# Altium footprint library 自建库.PcbLib: 169 footprints (part 2 of 11)
Each footprint in its own frame and in the unit in brackets; x right, y up, seen from the top. Pads: shape width x height; smd on the part's side, far side on the other; paste and mask are expansions set on the pad; w line width, h text height; cw(c..) or ccw(c..) is an arc to the next point about the centre after c.
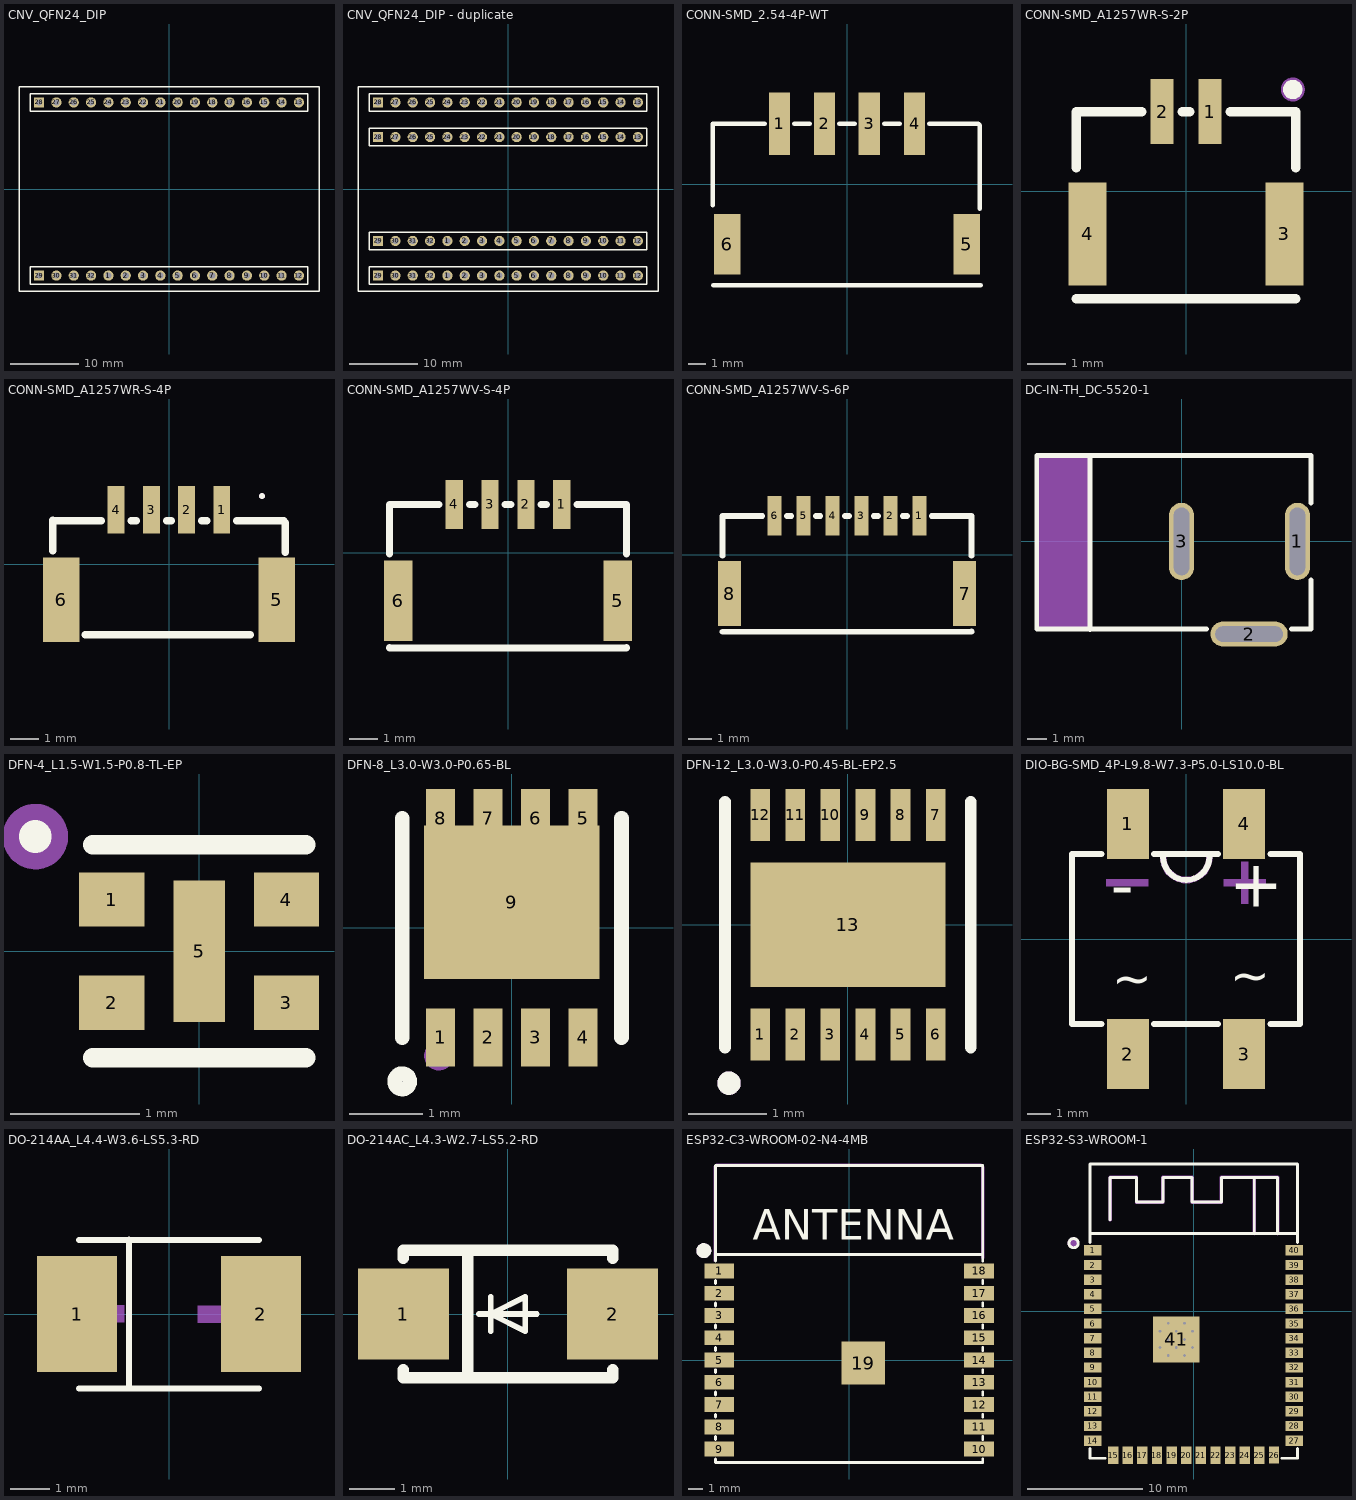
[diagram p1: the footprints below, top view; thin cyan lines are the x and y axes]

## CNV_QFN24_DIP [mm] "Connector; Header; 10 Position"
pads (32):
  round 1.5 hole 0.9: 1(-8.89,-12.7) 2(-6.35,-12.7) 3(-3.81,-12.7) 4(-1.27,-12.7) 5(1.27,-12.7) 6(3.81,-12.7) 7(6.35,-12.7) 8(8.89,-12.7) 9(11.43,-12.7) 10(13.97,-12.7) 11(16.51,-12.7) 12(19.05,-12.7) 13(19.05,12.7) 14(16.51,12.7) 15(13.97,12.7) 16(11.43,12.7) 17(8.89,12.7) 18(6.35,12.7) 19(3.81,12.7) 20(1.27,12.7) 21(-1.27,12.7) 22(-3.81,12.7) 23(-6.35,12.7) 24(-8.89,12.7) 25(-11.43,12.7) 26(-13.97,12.7) 27(-16.51,12.7) 30(-16.51,-12.7) 31(-13.97,-12.7) 32(-11.43,-12.7)
  rect 1.5x1.5 hole 0.9: 28(-19.05,12.7) 29(-19.05,-12.7)
Top Overlay:
  lines w0.2: -22,-15 22,-15 22,15 -22,15 -22,-15 ; -20.32,-13.97 -20.32,-11.43 20.32,-11.43 20.32,-13.97 -20.32,-13.97 ; -20.32,11.43 -20.32,13.97 20.32,13.97 20.32,11.43 -20.32,11.43

## CNV_QFN24_DIP - duplicate [mm] "Connector; Header; 10 Position"
pads (64):
  round 1.5 hole 0.9: 1(-8.89,-12.7) 1(-8.89,-7.62) 2(-6.35,-12.7) 2(-6.35,-7.62) 3(-3.81,-12.7) 3(-3.81,-7.62) 4(-1.27,-12.7) 4(-1.27,-7.62) 5(1.27,-12.7) 5(1.27,-7.62) 6(3.81,-12.7) 6(3.81,-7.62) 7(6.35,-12.7) 7(6.35,-7.62) 8(8.89,-12.7) 8(8.89,-7.62) 9(11.43,-12.7) 9(11.43,-7.62) 10(13.97,-12.7) 10(13.97,-7.62) 11(16.51,-12.7) 11(16.51,-7.62) 12(19.05,-12.7) 12(19.05,-7.62) 13(19.05,7.62) 13(19.05,12.7) 14(16.51,7.62) 14(16.51,12.7) 15(13.97,7.62) 15(13.97,12.7) 16(11.43,7.62) 16(11.43,12.7) 17(8.89,7.62) 17(8.89,12.7) 18(6.35,7.62) 18(6.35,12.7) 19(3.81,7.62) 19(3.81,12.7) 20(1.27,7.62) 20(1.27,12.7) 21(-1.27,7.62) 21(-1.27,12.7) 22(-3.81,7.62) 22(-3.81,12.7) 23(-6.35,7.62) 23(-6.35,12.7) 24(-8.89,7.62) 24(-8.89,12.7) 25(-11.43,7.62) 25(-11.43,12.7) 26(-13.97,7.62) 26(-13.97,12.7) 27(-16.51,7.62) 27(-16.51,12.7) 30(-16.51,-12.7) 30(-16.51,-7.62) 31(-13.97,-12.7) 31(-13.97,-7.62) 32(-11.43,-12.7) 32(-11.43,-7.62)
  rect 1.5x1.5 hole 0.9: 28(-19.05,7.62) 28(-19.05,12.7) 29(-19.05,-12.7) 29(-19.05,-7.62)
Top Overlay:
  lines w0.2: -20.32,6.35 -20.32,8.89 ; -20.32,6.367 20.32,6.367 ; -20.32,8.907 20.32,8.907 ; 20.32,6.35 20.32,8.89 ; -22,-15 -22,15 22,15 22,-15 -22,-15 ; -20.32,-13.97 20.32,-13.97 20.32,-11.43 -20.32,-11.43 -20.32,-13.97 ; -20.32,-8.89 20.32,-8.89 20.32,-6.35 -20.32,-6.35 -20.32,-8.89 ; -20.32,11.43 20.32,11.43 20.32,13.97 -20.32,13.97 -20.32,11.43

## CONN-SMD_2.54-4P-WT [mm] "XH2.54_卧贴"
pads (6):
  rect 1.2x3.5 smd: 1(-3.81,3.4) 2(-1.27,3.4) 3(1.25,3.4) 4(3.81,3.4)
  rect 1.5x3.4 smd: 5(6.76,-3.4) 6(-6.76,-3.4)
Top Overlay:
  lines w0.254: -7.56,-1.21 -7.56,3.4 -7.41,3.4 -4.641,3.4 ; -7.53,-5.71 7.54,-5.71 ; -2.979,3.4 -2.091,3.4 ; -0.429,3.4 0.449,3.4 ; 2.111,3.4 2.989,3.4 ; 4.651,3.4 7.41,3.4 7.5,3.31 7.5,-1.4
3D body "XH2_54-SMD-4pin.stp": height 6, standoff 0, extent -7.373,-4.572 7.627,7.928

## CONN-SMD_A1257WR-S-2P [mm] "GH1.25-2pin卧贴"
pads (4):
  rect 0.6x1.7 smd: 1(0.625,2.088) 2(-0.625,2.088)
  rect 1x2.7 smd: 3(2.575,-1.111) 4(-2.575,-1.111)
Top Overlay:
  circle w0.254: c2.794,2.667 r0.127
  lines w0.254: -2.875,-2.811 2.875,-2.811 ; -2.875,0.62 -2.875,2.088 -1.156,2.088 ; -0.094,2.088 0.094,2.088 ; 1.156,2.088 2.875,2.088 2.875,0.62
Mechanical 15:
  circle w0.254: c2.794,2.667 r0.187
3D body "GH1.25_2pin.STEP": height 4.13, standoff -0.02, extent -2.88,-2.506 2.88,2.046

## CONN-SMD_A1257WR-S-4P [mm] "GH1.25-4pin卧贴"
pads (6):
  rect 0.6x1.7 smd: 1(1.874,1.925) 2(0.625,1.925) 3(-0.625,1.925) 4(-1.875,1.925)
  rect 1.3x3 smd: 5(3.825,-1.275) 6(-3.825,-1.275)
Top Overlay:
  lines w0.2: 3.302,2.407 ccw(c3.202,2.413) 3.302,2.413
  lines w0.254: -4.126,0.462 -4.126,1.551 ; -4.108,1.533 -2.406,1.533 ; -2.983,-2.513 2.895,-2.513 ; -1.344,1.533 -1.156,1.533 ; -0.094,1.533 0.094,1.533 ; 1.156,1.533 1.344,1.533 ; 2.405,1.533 4.074,1.533 4.129,1.478 4.129,0.408
Mechanical 15:
  lines w0.2: 3.302,2.407 ccw(c3.202,2.413) 3.302,2.413
3D body "GH1.25_4pin.stp": height 4.35, standoff 0, extent -4.125,-2.576 4.125,2.224

## CONN-SMD_A1257WV-S-4P [mm] "GH1.25-4pin立贴"
pads (6):
  rect 0.6x1.7 smd: 1(1.875,1.675) 2(0.625,1.675) 3(-0.625,1.675) 4(-1.875,1.675)
  rect 1x2.8 smd: 5(3.825,-1.675) 6(-3.825,-1.675)
Top Overlay:
  lines w0.254: -4.125,-3.306 -4.125,-3.325 4.125,-3.325 4.125,-3.306 ; -4.125,-0.044 -4.125,1.675 -2.406,1.675 ; -1.344,1.675 -1.156,1.675 ; -0.094,1.675 0.094,1.675 ; 1.156,1.675 1.344,1.675 ; 2.406,1.675 4.125,1.675 4.125,-0.044
3D body "GH1.25_4pin.stp": height 4.35, standoff 0, extent -4.125,-3.048 4.125,1.752

## CONN-SMD_A1257WV-S-6P [mm] "GH1.25-6pin卧贴"
pads (8):
  rect 0.6x1.7 smd: 1(3.125,1.675) 2(1.875,1.675) 3(0.625,1.675) 4(-0.625,1.675) 5(-1.875,1.675) 6(-3.125,1.675)
  rect 1x2.8 smd: 7(5.075,-1.675) 8(-5.075,-1.675)
Top Overlay:
  lines w0.254: -5.375,-3.325 5.375,-3.325 5.375,-3.306 ; -5.375,-0.044 -5.375,1.675 -3.656,1.675 ; -2.594,1.675 -2.406,1.675 ; -1.344,1.675 -1.156,1.675 ; -0.094,1.675 0.094,1.675 ; 1.156,1.675 1.344,1.675 ; 2.406,1.675 2.594,1.675 ; 3.656,1.675 5.375,1.675 5.375,-0.044
3D body "GH1.25_6pin.stp": height 4.35, standoff 0, extent -5.375,-3.211 5.375,1.589

## DC-IN-TH_DC-5520-1 [mm]
pads (3):
  oval 1.3x4 hole 0.8 slot 3.5 at 90 deg: 1(6,0) 3(0,0)
  oval 4x1.3 hole 0.8 slot 3.5 at 0 deg: 2(3.5,-4.8)
Top Overlay:
  lines w0.254: -7.5,4.445 -7.5,-4.547 0.665,-4.547 1.298,-4.547 ; -7.5,4.453 6.7,4.453 6.7,1.988 ; -4.744,-4.555 -4.744,4.445 ; 5.702,-4.547 6.7,-4.547 6.7,-1.988
Mechanical 15:
  region: -7.541,4.458 -4.747,4.458 -4.747,-4.559 -7.541,-4.559
3D body "DC-005-5a-3_0.stp": height 11, standoff -3.6, extent -7.5,-4.951 6.5,4.449

## DFN-4_L1.5-W1.5-P0.8-TL-EP [mm]
pads (5):
  rect 0.505x0.42 smd: 1(-0.677,0.4) 2(-0.677,-0.4) 3(0.677,-0.4) 4(0.677,0.4)
  rect 0.4x1.1 smd: 5(0,0)
Top Overlay:
  circle w0.254: c-1.27,0.889 r0
  lines w0.152: -0.826,-0.826 0.826,-0.826 ; -0.826,0.826 0.826,0.826
Mechanical 15:
  circle w0.254: c-1.27,0.889 r0.127
3D body "DFN4-1216-0.STEP": height 0.5, standoff 0, extent -0.8,-0.6 0.8,0.6

## DFN-8_L3.0-W3.0-P0.65-BL [mm]
pads (9):
  rect 0.4x0.8 smd: 1(-0.975,-1.5) 2(-0.325,-1.5) 3(0.325,-1.5) 4(0.975,-1.5) 5(0.975,1.5) 6(0.325,1.5) 7(-0.325,1.5) 8(-0.975,1.5)
  rect 2.4x2.1 smd: 9(0,0.35)
Top Overlay:
  circle w0.2: c-1.5,-2.1 r0.105
  lines w0.2: -1.5,-1.5 -1.5,1.5 ; 1.5,-1.5 1.5,1.5
Top Paste:
  region: -0.775,-1.9 -1.175,-1.9 -1.175,-1.1 -0.775,-1.1
  region: -0.125,-1.9 -0.525,-1.9 -0.525,-1.1 -0.125,-1.1
  region: 0.525,-1.9 0.125,-1.9 0.125,-1.1 0.525,-1.1
  region: 1.175,-1.9 0.775,-1.9 0.775,-1.1 1.175,-1.1
  region: 1.2,-0.7 -1.2,-0.7 -1.2,1.4 -1.175,1.4 -1.175,1.9 -0.775,1.9 -0.775,1.4 -0.525,1.4 -0.525,1.9 -0.125,1.9 -0.125,1.4 0.125,1.4 0.125,1.9 0.525,1.9 0.525,1.4 0.775,1.4 0.775,1.9 1.175,1.9 1.175,1.4 1.2,1.4
Mechanical 15:
  circle w0.2: c-1,-1.75 r0.1
3D body "AON7544.stp": height 0.72, standoff 0, extent -1.5,-1.51 1.5,1.51

## DFN-12_L3.0-W3.0-P0.45-BL-EP2.5 [mm]
pads (13):
  rect 0.252x0.665 smd: 1(-1.125,-1.407) 2(-0.675,-1.407) 3(-0.225,-1.407) 4(0.225,-1.407) 5(0.675,-1.407) 6(1.125,-1.407) 7(1.125,1.407) 8(0.675,1.407) 9(0.225,1.407) 10(-0.225,1.407) 11(-0.675,1.407) 12(-1.125,1.407)
  rect 2.5x1.6 smd: 13(0,0)
Top Overlay:
  circle w0.15: c-1.524,-2.032 r0.075
  lines w0.152: -1.576,-1.576 -1.576,1.576 ; 1.576,-1.576 1.576,1.576
Mechanical 15:
  circle w0.15: c-1.524,-2.032 r0.075
3D body "DFN12(3x3, pitch 0_45).STEP": height 0.76, standoff 0, extent -1.5,-1.501 1.5,1.501

## DIO-BG-SMD_4P-L9.8-W7.3-P5.0-LS10.0-BL [mm] "整流桥"
pads (4):
  rect 1.8x3 smd paste+0 mask+0.051: 1(-2.5,4.95) 2(-2.5,-4.95) 3(2.5,-4.95) 4(2.5,4.95)
Top Overlay:
  lines w0.254: -4.9,3.61 -4.9,-3.65 -3.631,-3.65 ; -4.9,3.65 -3.631,3.65 ; -1.369,-3.65 1.369,-3.65 ; -1.369,3.65 1.369,3.65 ; -0.981,3.52 ccw(c0.011,3.527) 1.004,3.52 ; 3.631,-3.65 4.9,-3.65 4.9,3.65 3.631,3.65
  text "+" at 1.853,1.383 h2.03
  text "-" at -3.226,1.347 h2.03
  text "~" at 1.905,-2.788 h2.54
  text "~" at -3.175,-2.915 h2.54
Mechanical 15:
  region: -0.854,3.521 -0.846,3.409 -0.786,3.192 -0.673,2.998 -0.513,2.839 -0.318,2.727 -0.101,2.67 0.124,2.67 0.341,2.727 0.536,2.839 0.695,2.998 0.809,3.192 0.868,3.409 0.877,3.521 0.877,3.574 0.952,3.647 1.057,3.647 1.131,3.572 1.131,3.519 1.13,3.372 1.052,3.089 0.904,2.836 0.696,2.629 0.442,2.483 0.158,2.407 -0.135,2.407 -0.419,2.483 -0.673,2.629 -0.882,2.836 -1.029,3.089 -1.107,3.372 -1.108,3.519 -1.108,3.572 -1.035,3.647 -0.929,3.647 -0.854,3.573 -0.854,3.521
  region: 1.631,2.565 3.431,2.565 3.431,2.265 1.631,2.265
  region: 2.367,1.513 2.367,3.313 2.667,3.313 2.667,1.513
  region: -3.429,2.563 -1.629,2.563 -1.629,2.263 -3.429,2.263
3D body "dio.stp": height 1.56, standoff 0, extent -4.9,-4.975 4.9,4.975

## DO-214AA_L4.4-W3.6-LS5.3-RD [mm]
pads (2):
  rect 2.024x2.94 smd: 1(-2.322,0) 2(2.322,0)
Top Overlay:
  lines w0.152: -2.276,-1.876 2.276,-1.876 ; -2.276,1.876 2.276,1.876 ; -1.016,-1.873 -1.016,1.88
Mechanical 15:
  region: 1.808,-1.44 1.808,1.44 1.376,1.44 1.376,-1.44
  region: -2.858,-0.203 -2.858,0.229 -1.13,0.229 -1.13,-0.203
  region: 2.456,-0.216 2.456,0.216 0.728,0.216 0.728,-0.216
3D body "DO-214AA.stp": height 2.1, standoff 0, extent -2.7,-1.8 2.7,1.8

## DO-214AC_L4.3-W2.7-LS5.2-RD [mm]
pads (2):
  rect 2x2 smd: 1(-2.3,0) 2(2.3,0)
Top Overlay:
  lines w0.127: -0.635,0 0.635,0 ; -0.381,-0.381 -0.381,0 ; -0.381,0.381 -0.381,0 ; -0.381,0 0.381,0.381 0.381,0 0.381,-0.381 -0.381,0
  lines w0.254: -2.3,-1.231 -2.3,-1.4 2.3,-1.4 2.3,-1.231 ; -2.3,1.231 -2.3,1.4 2.3,1.4 2.3,1.231 ; -0.889,-1.4 -0.889,1.4
Mechanical 15:
  region: -2.98,-0.157 -2.983,-0.14 -2.983,0.076 -1.619,0.074 -1.61,0.053 -1.61,-0.164
  region: 2.281,0.447 2.281,-0.425 2.283,-0.427 2.39,-0.427 2.395,-0.422 2.395,0.447 2.39,0.452 2.273,0.452
  region: 2.995,0.028 1.617,0.028 1.617,0.136 1.72,0.142 2.987,0.14 2.991,0.144 2.991,0.032 2.993,0.03
3D body "do214.stp": height 2.2, standoff 0, extent -2.6,-1.35 2.6,1.35

## ESP32-C3-WROOM-02-N4-4MB [mm]
pads (19):
  rect 2x1 smd: 1(-8.75,6) 2(-8.75,4.5) 3(-8.75,3) 4(-8.75,1.5) 5(-8.75,0) 6(-8.75,-1.5) 7(-8.75,-3) 8(-8.75,-4.5) 9(-8.75,-6) 10(8.75,-6) 11(8.75,-4.5) 12(8.75,-3) 13(8.75,-1.5) 14(8.75,0) 15(8.75,1.5) 16(8.75,3) 17(8.75,4.5) 18(8.75,6)
  rect 2.921x2.921 smd: 19(0.96,-0.2)
Top Overlay:
  circle w0.5: c-9.779,7.366 r0.25
  lines w0.2: -9,-6.654 -9,-6.9 9,-6.9 9,-6.654 ; -9,-5.346 -9,-5.154 ; -9,-3.846 -9,-3.654 ; -9,-2.346 -9,-2.154 ; -9,-0.846 -9,-0.654 ; -9,0.654 -9,0.846 ; -9,2.154 -9,2.346 ; -9,3.654 -9,3.846 ; -9,5.154 -9,5.346 ; -9,6.654 -9,13.1 9,13.1 9,6.654 ; -9,7.1 9,7.1 ; 9,-5.346 9,-5.154 ; 9,-3.846 9,-3.654 ; 9,-2.346 9,-2.154 ; 9,-0.846 9,-0.654 ; 9,0.654 9,0.846 ; 9,2.154 9,2.346 ; 9,3.654 9,3.846 ; 9,5.154 9,5.346
  text "ANTENNA" at -6.5,8.084 h2.03
Mechanical 15:
  circle w0.5: c-9.779,7.366 r0.25
  region: -9.1,6.65 -9.1,13.05 -8.95,13.2 8.9,13.2 9.1,13 9.1,6.85 8.9,6.85 8.9,13 -8.9,13 -8.9,6.7 -8.9,6.65
3D body "ESP32-C3-WROOM-02.STEP": height 3.25, standoff -0.01, extent -9.01,-6.9 9.01,13.1

## ESP32-S3-WROOM-1 [mm]
pads (41):
  rect 1.5x0.9 smd: 1(-8.75,5.276) 2(-8.75,4.006) 3(-8.75,2.736) 4(-8.75,1.466) 5(-8.75,0.196) 6(-8.75,-1.074) 7(-8.75,-2.344) 8(-8.75,-3.614) 9(-8.75,-4.884) 10(-8.75,-6.154) 11(-8.75,-7.424) 12(-8.75,-8.694) 13(-8.75,-9.964) 14(-8.75,-11.234) 27(8.75,-11.234) 28(8.75,-9.964) 29(8.75,-8.694) 30(8.75,-7.424) 31(8.75,-6.154) 32(8.75,-4.884) 33(8.75,-3.614) 34(8.75,-2.344) 35(8.75,-1.074) 36(8.75,0.196) 37(8.75,1.466) 38(8.75,2.736) 39(8.75,4.006) 40(8.75,5.276)
  rect 0.9x1.5 smd: 15(-6.985,-12.515) 16(-5.715,-12.514) 17(-4.445,-12.514) 18(-3.175,-12.514) 19(-1.905,-12.514) 20(-0.635,-12.514) 21(0.635,-12.514) 22(1.905,-12.514) 23(3.175,-12.514) 24(4.445,-12.514) 25(5.715,-12.514) 26(6.985,-12.484)
  rect 4x4 smd: 41(-1.501,-2.445)
via -2.2,-3.845 diameter 0.4 hole 0.25
via -2.2,-2.445 diameter 0.4 hole 0.25
via -2.9,-1.745 diameter 0.4 hole 0.25
via -2.9,-3.145 diameter 0.4 hole 0.25
via -0.8,-3.845 diameter 0.4 hole 0.25
via -0.8,-2.445 diameter 0.4 hole 0.25
via -0.1,-1.745 diameter 0.4 hole 0.25
via -0.1,-3.145 diameter 0.4 hole 0.25
via -1.5,-3.145 diameter 0.4 hole 0.25
via -1.5,-1.745 diameter 0.4 hole 0.25
via -0.8,-1.045 diameter 0.4 hole 0.25
via -2.2,-1.045 diameter 0.4 hole 0.25
Top Overlay:
  circle w0.254: c-10.414,5.905 r0.402
  lines w0.254: -9,-11.916 -9,-12.763 -7.666,-12.763 ; -9,5.957 -9,12.776 9,12.776 ; -9,6.736 9.017,6.736 ; -7.239,7.938 -7.239,11.621 -4.953,11.621 -4.953,9.462 -2.667,9.462 -2.667,11.621 -0.127,11.621 -0.127,9.462 2.413,9.462 2.413,11.621 5.265,11.621 5.265,6.736 ; 5.062,11.621 7.297,11.621 7.297,6.736 ; 7.666,-12.763 9.017,-12.763 9.017,-11.916 ; 9.017,5.957 9.017,12.764
Mechanical 15:
  drawing of 2 lines, arcs and shapes, not listed
3D body "ESP32-S3-WROOM-1_20211021.STEP": height 3.1, standoff 0, extent -9,-12.763 9,12.737